# Altium footprint library Package_DIP.PcbLib: 236 footprints (part 10 of 15)
Each footprint in its own frame and in the unit in brackets; x right, y up, seen from the top. Pads: shape width x height; smd on the part's side, far side on the other; paste and mask are expansions set on the pad; w line width, h text height; cw(c..) or ccw(c..) is an arc to the next point about the centre after c.
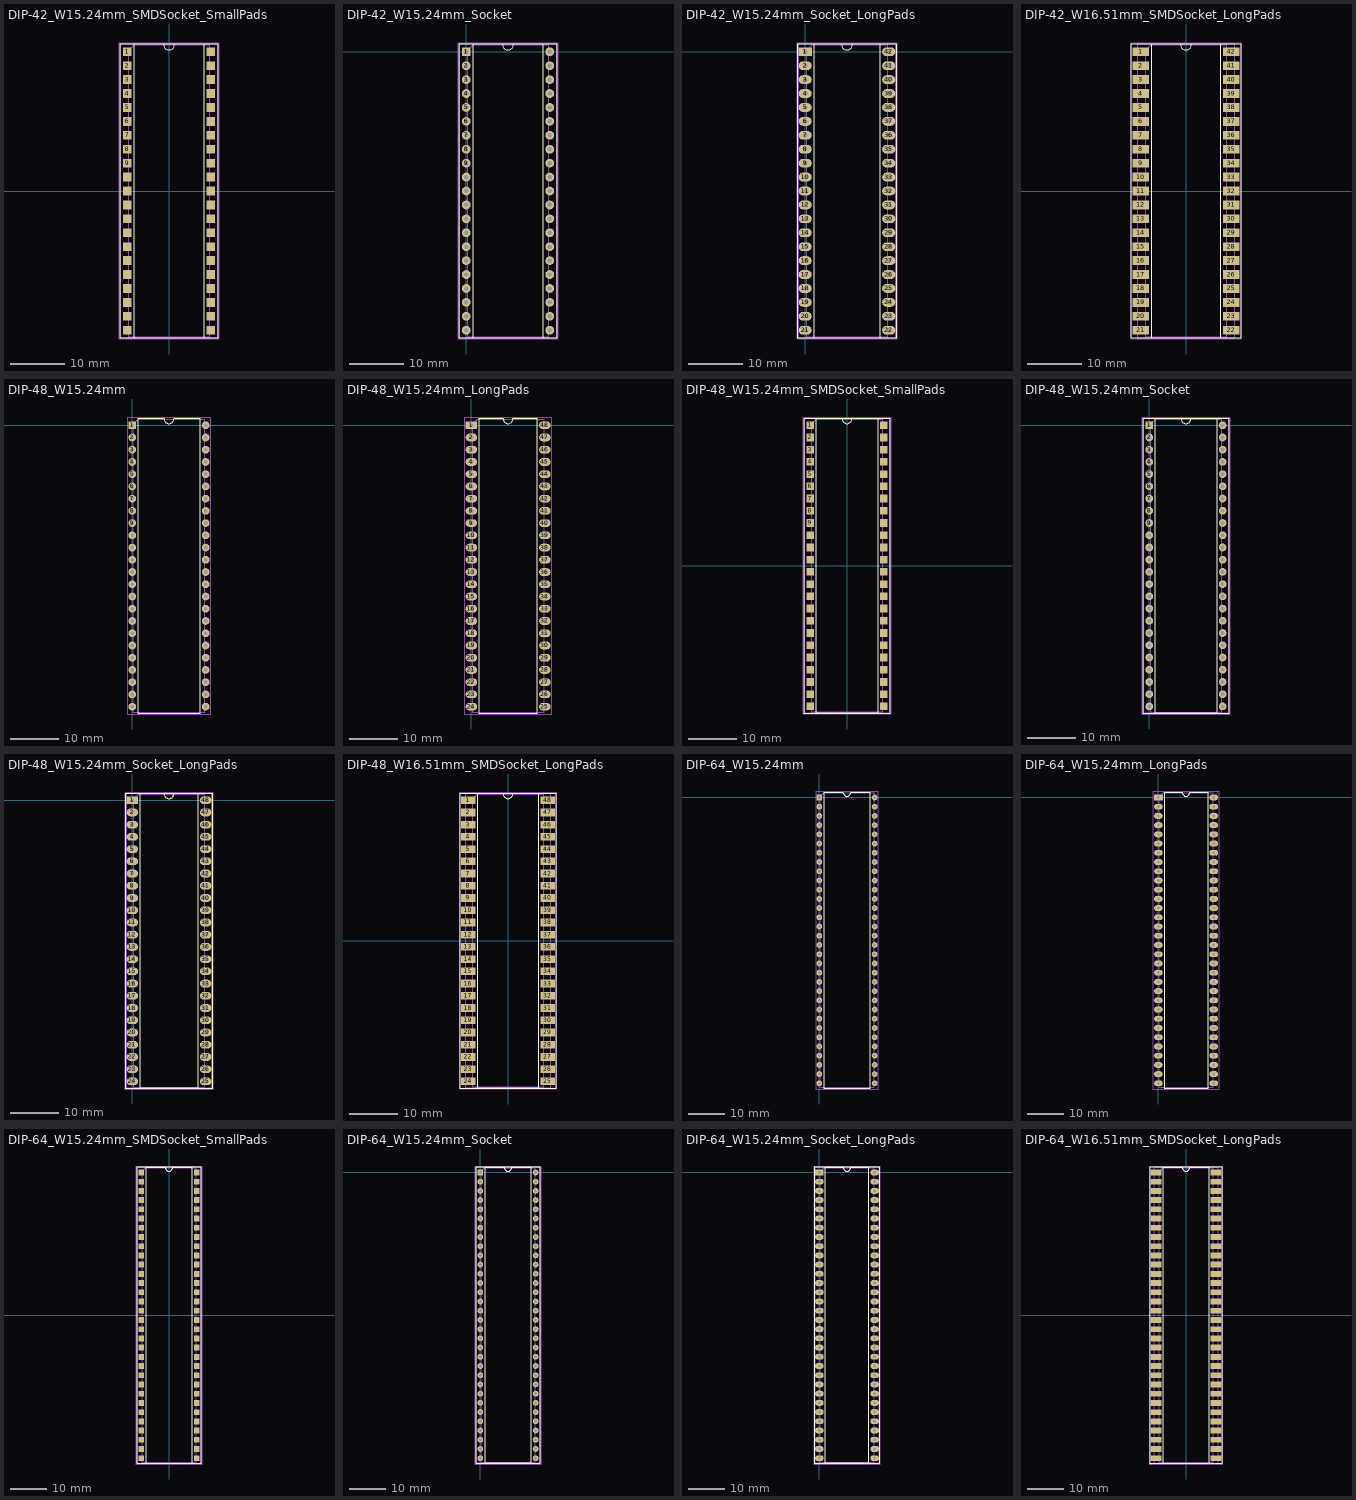
[diagram p9: the footprints below, top view; thin cyan lines are the x and y axes]

## DIP-42_W15.24mm_SMDSocket_SmallPads [mm]
pads (42):
  rect 1.6x1.6 smd: 1(-7.62,25.4) 2(-7.62,22.86) 3(-7.62,20.32) 4(-7.62,17.78) 5(-7.62,15.24) 6(-7.62,12.7) 7(-7.62,10.16) 8(-7.62,7.62) 9(-7.62,5.08) 10(-7.62,2.54) 11(-7.62,0) 12(-7.62,-2.54) 13(-7.62,-5.08) 14(-7.62,-7.62) 15(-7.62,-10.16) 16(-7.62,-12.7) 17(-7.62,-15.24) 18(-7.62,-17.78) 19(-7.62,-20.32) 20(-7.62,-22.86) 21(-7.62,-25.4) 22(7.62,-25.4) 23(7.62,-22.86) 24(7.62,-20.32) 25(7.62,-17.78) 26(7.62,-15.24) 27(7.62,-12.7) 28(7.62,-10.16) 29(7.62,-7.62) 30(7.62,-5.08) 31(7.62,-2.54) 32(7.62,0) 33(7.62,2.54) 34(7.62,5.08) 35(7.62,7.62) 36(7.62,10.16) 37(7.62,12.7) 38(7.62,15.24) 39(7.62,17.78) 40(7.62,20.32) 41(7.62,22.86) 42(7.62,25.4)
F.SilkS:
  lines w0.12: -8.95,-26.79 -8.95,26.79 8.95,26.79 8.95,-26.79 -8.95,-26.79 ; -6.46,-26.73 -6.46,26.73 -1,26.73 ccw(c0,26.73) 1,26.73 6.46,26.73 6.46,-26.73 -6.46,-26.73
F.CrtYd:
  lines w0.05: -9.15,-27 9.15,-27 9.15,27 -9.15,27 -9.15,-27
F.Fab:
  lines w0.1: -8.89,-26.73 -8.89,26.73 8.89,26.73 8.89,-26.73 -8.89,-26.73 ; -7.365,-26.67 -7.365,25.67 -6.365,26.67 7.365,26.67 7.365,-26.67 -7.365,-26.67
  text "'.Designator'" at -4.047,-0.84 h1

## DIP-42_W15.24mm_Socket [mm]
pads (42):
  rect 1.6x1.6 hole 0.8: 1(0,0)
  rrect100% 1.6x1.6 hole 0.8: 2(0,-2.54) 3(0,-5.08) 4(0,-7.62) 5(0,-10.16) 6(0,-12.7) 7(0,-15.24) 8(0,-17.78) 9(0,-20.32) 10(0,-22.86) 11(0,-25.4) 12(0,-27.94) 13(0,-30.48) 14(0,-33.02) 15(0,-35.56) 16(0,-38.1) 17(0,-40.64) 18(0,-43.18) 19(0,-45.72) 20(0,-48.26) 21(0,-50.8) 22(15.24,-50.8) 23(15.24,-48.26) 24(15.24,-45.72) 25(15.24,-43.18) 26(15.24,-40.64) 27(15.24,-38.1) 28(15.24,-35.56) 29(15.24,-33.02) 30(15.24,-30.48) 31(15.24,-27.94) 32(15.24,-25.4) 33(15.24,-22.86) 34(15.24,-20.32) 35(15.24,-17.78) 36(15.24,-15.24) 37(15.24,-12.7) 38(15.24,-10.16) 39(15.24,-7.62) 40(15.24,-5.08) 41(15.24,-2.54) 42(15.24,0)
F.SilkS:
  lines w0.12: -1.33,-52.19 16.57,-52.19 16.57,1.39 -1.33,1.39 -1.33,-52.19 ; 1.16,-52.13 1.16,1.33 6.62,1.33 ccw(c7.62,1.33) 8.62,1.33 14.08,1.33 14.08,-52.13 1.16,-52.13
F.CrtYd:
  lines w0.05: -1.55,-52.4 16.8,-52.4 16.8,1.6 -1.55,1.6 -1.55,-52.4
F.Fab:
  lines w0.1: -1.27,-52.13 -1.27,1.33 16.51,1.33 16.51,-52.13 -1.27,-52.13 ; 0.255,-52.07 14.985,-52.07 14.985,1.27 1.255,1.27 0.255,0.27 0.255,-52.07
  text "'.Designator'" at 3.573,-26.24 h1

## DIP-42_W15.24mm_Socket_LongPads [mm]
pads (42):
  rect 2.4x1.6 hole 0.8: 1(0,0)
  rrect100% 2.4x1.6 hole 0.8: 2(0,-2.54) 3(0,-5.08) 4(0,-7.62) 5(0,-10.16) 6(0,-12.7) 7(0,-15.24) 8(0,-17.78) 9(0,-20.32) 10(0,-22.86) 11(0,-25.4) 12(0,-27.94) 13(0,-30.48) 14(0,-33.02) 15(0,-35.56) 16(0,-38.1) 17(0,-40.64) 18(0,-43.18) 19(0,-45.72) 20(0,-48.26) 21(0,-50.8) 22(15.24,-50.8) 23(15.24,-48.26) 24(15.24,-45.72) 25(15.24,-43.18) 26(15.24,-40.64) 27(15.24,-38.1) 28(15.24,-35.56) 29(15.24,-33.02) 30(15.24,-30.48) 31(15.24,-27.94) 32(15.24,-25.4) 33(15.24,-22.86) 34(15.24,-20.32) 35(15.24,-17.78) 36(15.24,-15.24) 37(15.24,-12.7) 38(15.24,-10.16) 39(15.24,-7.62) 40(15.24,-5.08) 41(15.24,-2.54) 42(15.24,0)
F.SilkS:
  lines w0.12: -1.44,-52.19 16.68,-52.19 16.68,1.39 -1.44,1.39 -1.44,-52.19 ; 1.56,-52.13 13.68,-52.13 13.68,1.33 8.62,1.33 cw(c7.62,1.33) 6.62,1.33 1.56,1.33 1.56,-52.13
F.CrtYd:
  lines w0.05: -1.55,-52.4 -1.55,1.6 16.8,1.6 16.8,-52.4 -1.55,-52.4
F.Fab:
  lines w0.1: -1.27,-52.13 -1.27,1.33 16.51,1.33 16.51,-52.13 -1.27,-52.13 ; 0.255,-52.07 14.985,-52.07 14.985,1.27 1.255,1.27 0.255,0.27 0.255,-52.07
  text "'.Designator'" at 3.573,-26.24 h1

## DIP-42_W16.51mm_SMDSocket_LongPads [mm]
pads (42):
  rect 3.1x1.6 smd: 1(-8.255,25.4) 2(-8.255,22.86) 3(-8.255,20.32) 4(-8.255,17.78) 5(-8.255,15.24) 6(-8.255,12.7) 7(-8.255,10.16) 8(-8.255,7.62) 9(-8.255,5.08) 10(-8.255,2.54) 11(-8.255,0) 12(-8.255,-2.54) 13(-8.255,-5.08) 14(-8.255,-7.62) 15(-8.255,-10.16) 16(-8.255,-12.7) 17(-8.255,-15.24) 18(-8.255,-17.78) 19(-8.255,-20.32) 20(-8.255,-22.86) 21(-8.255,-25.4) 22(8.255,-25.4) 23(8.255,-22.86) 24(8.255,-20.32) 25(8.255,-17.78) 26(8.255,-15.24) 27(8.255,-12.7) 28(8.255,-10.16) 29(8.255,-7.62) 30(8.255,-5.08) 31(8.255,-2.54) 32(8.255,0) 33(8.255,2.54) 34(8.255,5.08) 35(8.255,7.62) 36(8.255,10.16) 37(8.255,12.7) 38(8.255,15.24) 39(8.255,17.78) 40(8.255,20.32) 41(8.255,22.86) 42(8.255,25.4)
F.SilkS:
  lines w0.12: -10.045,-26.79 10.045,-26.79 10.045,26.79 -10.045,26.79 -10.045,-26.79 ; -6.345,-26.73 6.345,-26.73 6.345,26.73 1,26.73 cw(c0,26.73) -1,26.73 -6.345,26.73 -6.345,-26.73
F.CrtYd:
  lines w0.05: -10.1,-27 -10.1,27 10.1,27 10.1,-27 -10.1,-27
F.Fab:
  lines w0.1: -8.89,-26.73 -8.89,26.73 8.89,26.73 8.89,-26.73 -8.89,-26.73 ; -7.365,-26.67 -7.365,25.67 -6.365,26.67 7.365,26.67 7.365,-26.67 -7.365,-26.67
  text "'.Designator'" at -4.047,-0.84 h1

## DIP-48_W15.24mm [mm]
pads (48):
  rect 1.6x1.6 hole 0.8: 1(0,0)
  rrect100% 1.6x1.6 hole 0.8: 2(0,-2.54) 3(0,-5.08) 4(0,-7.62) 5(0,-10.16) 6(0,-12.7) 7(0,-15.24) 8(0,-17.78) 9(0,-20.32) 10(0,-22.86) 11(0,-25.4) 12(0,-27.94) 13(0,-30.48) 14(0,-33.02) 15(0,-35.56) 16(0,-38.1) 17(0,-40.64) 18(0,-43.18) 19(0,-45.72) 20(0,-48.26) 21(0,-50.8) 22(0,-53.34) 23(0,-55.88) 24(0,-58.42) 25(15.24,-58.42) 26(15.24,-55.88) 27(15.24,-53.34) 28(15.24,-50.8) 29(15.24,-48.26) 30(15.24,-45.72) 31(15.24,-43.18) 32(15.24,-40.64) 33(15.24,-38.1) 34(15.24,-35.56) 35(15.24,-33.02) 36(15.24,-30.48) 37(15.24,-27.94) 38(15.24,-25.4) 39(15.24,-22.86) 40(15.24,-20.32) 41(15.24,-17.78) 42(15.24,-15.24) 43(15.24,-12.7) 44(15.24,-10.16) 45(15.24,-7.62) 46(15.24,-5.08) 47(15.24,-2.54) 48(15.24,0)
F.SilkS:
  lines w0.12: 1.16,-59.75 14.08,-59.75 14.08,1.33 8.62,1.33 cw(c7.62,1.33) 6.62,1.33 1.16,1.33 1.16,-59.75
F.CrtYd:
  lines w0.05: -1.05,-59.95 16.3,-59.95 16.3,1.55 -1.05,1.55 -1.05,-59.95
F.Fab:
  lines w0.1: 0.255,-59.69 0.255,0.27 1.255,1.27 14.985,1.27 14.985,-59.69 0.255,-59.69
  text "'.Designator'" at 3.573,-30.05 h1

## DIP-48_W15.24mm_LongPads [mm]
pads (48):
  rect 2.4x1.6 hole 0.8: 1(0,0)
  rrect100% 2.4x1.6 hole 0.8: 2(0,-2.54) 3(0,-5.08) 4(0,-7.62) 5(0,-10.16) 6(0,-12.7) 7(0,-15.24) 8(0,-17.78) 9(0,-20.32) 10(0,-22.86) 11(0,-25.4) 12(0,-27.94) 13(0,-30.48) 14(0,-33.02) 15(0,-35.56) 16(0,-38.1) 17(0,-40.64) 18(0,-43.18) 19(0,-45.72) 20(0,-48.26) 21(0,-50.8) 22(0,-53.34) 23(0,-55.88) 24(0,-58.42) 25(15.24,-58.42) 26(15.24,-55.88) 27(15.24,-53.34) 28(15.24,-50.8) 29(15.24,-48.26) 30(15.24,-45.72) 31(15.24,-43.18) 32(15.24,-40.64) 33(15.24,-38.1) 34(15.24,-35.56) 35(15.24,-33.02) 36(15.24,-30.48) 37(15.24,-27.94) 38(15.24,-25.4) 39(15.24,-22.86) 40(15.24,-20.32) 41(15.24,-17.78) 42(15.24,-15.24) 43(15.24,-12.7) 44(15.24,-10.16) 45(15.24,-7.62) 46(15.24,-5.08) 47(15.24,-2.54) 48(15.24,0)
F.SilkS:
  lines w0.12: 1.56,-59.75 1.56,1.33 6.62,1.33 ccw(c7.62,1.33) 8.62,1.33 13.68,1.33 13.68,-59.75 1.56,-59.75
F.CrtYd:
  lines w0.05: -1.5,-59.95 16.7,-59.95 16.7,1.55 -1.5,1.55 -1.5,-59.95
F.Fab:
  lines w0.1: 0.255,-59.69 14.985,-59.69 14.985,1.27 1.255,1.27 0.255,0.27 0.255,-59.69
  text "'.Designator'" at 3.573,-30.05 h1

## DIP-48_W15.24mm_SMDSocket_SmallPads [mm]
pads (48):
  rect 1.6x1.6 smd: 1(-7.62,29.21) 2(-7.62,26.67) 3(-7.62,24.13) 4(-7.62,21.59) 5(-7.62,19.05) 6(-7.62,16.51) 7(-7.62,13.97) 8(-7.62,11.43) 9(-7.62,8.89) 10(-7.62,6.35) 11(-7.62,3.81) 12(-7.62,1.27) 13(-7.62,-1.27) 14(-7.62,-3.81) 15(-7.62,-6.35) 16(-7.62,-8.89) 17(-7.62,-11.43) 18(-7.62,-13.97) 19(-7.62,-16.51) 20(-7.62,-19.05) 21(-7.62,-21.59) 22(-7.62,-24.13) 23(-7.62,-26.67) 24(-7.62,-29.21) 25(7.62,-29.21) 26(7.62,-26.67) 27(7.62,-24.13) 28(7.62,-21.59) 29(7.62,-19.05) 30(7.62,-16.51) 31(7.62,-13.97) 32(7.62,-11.43) 33(7.62,-8.89) 34(7.62,-6.35) 35(7.62,-3.81) 36(7.62,-1.27) 37(7.62,1.27) 38(7.62,3.81) 39(7.62,6.35) 40(7.62,8.89) 41(7.62,11.43) 42(7.62,13.97) 43(7.62,16.51) 44(7.62,19.05) 45(7.62,21.59) 46(7.62,24.13) 47(7.62,26.67) 48(7.62,29.21)
F.SilkS:
  lines w0.12: -8.95,-30.6 -8.95,30.6 8.95,30.6 8.95,-30.6 -8.95,-30.6 ; -6.46,-30.54 -6.46,30.54 -1,30.54 ccw(c0,30.54) 1,30.54 6.46,30.54 6.46,-30.54 -6.46,-30.54
F.CrtYd:
  lines w0.05: -9.15,-30.8 9.15,-30.8 9.15,30.8 -9.15,30.8 -9.15,-30.8
F.Fab:
  lines w0.1: -8.89,-30.54 8.89,-30.54 8.89,30.54 -8.89,30.54 -8.89,-30.54 ; -7.365,-30.48 7.365,-30.48 7.365,30.48 -6.365,30.48 -7.365,29.48 -7.365,-30.48
  text "'.Designator'" at -4.047,-0.84 h1

## DIP-48_W15.24mm_Socket [mm]
pads (48):
  rect 1.6x1.6 hole 0.8: 1(0,0)
  rrect100% 1.6x1.6 hole 0.8: 2(0,-2.54) 3(0,-5.08) 4(0,-7.62) 5(0,-10.16) 6(0,-12.7) 7(0,-15.24) 8(0,-17.78) 9(0,-20.32) 10(0,-22.86) 11(0,-25.4) 12(0,-27.94) 13(0,-30.48) 14(0,-33.02) 15(0,-35.56) 16(0,-38.1) 17(0,-40.64) 18(0,-43.18) 19(0,-45.72) 20(0,-48.26) 21(0,-50.8) 22(0,-53.34) 23(0,-55.88) 24(0,-58.42) 25(15.24,-58.42) 26(15.24,-55.88) 27(15.24,-53.34) 28(15.24,-50.8) 29(15.24,-48.26) 30(15.24,-45.72) 31(15.24,-43.18) 32(15.24,-40.64) 33(15.24,-38.1) 34(15.24,-35.56) 35(15.24,-33.02) 36(15.24,-30.48) 37(15.24,-27.94) 38(15.24,-25.4) 39(15.24,-22.86) 40(15.24,-20.32) 41(15.24,-17.78) 42(15.24,-15.24) 43(15.24,-12.7) 44(15.24,-10.16) 45(15.24,-7.62) 46(15.24,-5.08) 47(15.24,-2.54) 48(15.24,0)
F.SilkS:
  lines w0.12: -1.33,-59.81 16.57,-59.81 16.57,1.39 -1.33,1.39 -1.33,-59.81 ; 1.16,-59.75 1.16,1.33 6.62,1.33 ccw(c7.62,1.33) 8.62,1.33 14.08,1.33 14.08,-59.75 1.16,-59.75
F.CrtYd:
  lines w0.05: -1.55,-60 -1.55,1.6 16.8,1.6 16.8,-60 -1.55,-60
F.Fab:
  lines w0.1: -1.27,-59.75 16.51,-59.75 16.51,1.33 -1.27,1.33 -1.27,-59.75 ; 0.255,-59.69 0.255,0.27 1.255,1.27 14.985,1.27 14.985,-59.69 0.255,-59.69
  text "'.Designator'" at 3.573,-30.05 h1

## DIP-48_W15.24mm_Socket_LongPads [mm]
pads (48):
  rect 2.4x1.6 hole 0.8: 1(0,0)
  rrect100% 2.4x1.6 hole 0.8: 2(0,-2.54) 3(0,-5.08) 4(0,-7.62) 5(0,-10.16) 6(0,-12.7) 7(0,-15.24) 8(0,-17.78) 9(0,-20.32) 10(0,-22.86) 11(0,-25.4) 12(0,-27.94) 13(0,-30.48) 14(0,-33.02) 15(0,-35.56) 16(0,-38.1) 17(0,-40.64) 18(0,-43.18) 19(0,-45.72) 20(0,-48.26) 21(0,-50.8) 22(0,-53.34) 23(0,-55.88) 24(0,-58.42) 25(15.24,-58.42) 26(15.24,-55.88) 27(15.24,-53.34) 28(15.24,-50.8) 29(15.24,-48.26) 30(15.24,-45.72) 31(15.24,-43.18) 32(15.24,-40.64) 33(15.24,-38.1) 34(15.24,-35.56) 35(15.24,-33.02) 36(15.24,-30.48) 37(15.24,-27.94) 38(15.24,-25.4) 39(15.24,-22.86) 40(15.24,-20.32) 41(15.24,-17.78) 42(15.24,-15.24) 43(15.24,-12.7) 44(15.24,-10.16) 45(15.24,-7.62) 46(15.24,-5.08) 47(15.24,-2.54) 48(15.24,0)
F.SilkS:
  lines w0.12: -1.44,-59.81 16.68,-59.81 16.68,1.39 -1.44,1.39 -1.44,-59.81 ; 1.56,-59.75 1.56,1.33 6.62,1.33 ccw(c7.62,1.33) 8.62,1.33 13.68,1.33 13.68,-59.75 1.56,-59.75
F.CrtYd:
  lines w0.05: -1.55,-60 16.8,-60 16.8,1.6 -1.55,1.6 -1.55,-60
F.Fab:
  lines w0.1: -1.27,-59.75 -1.27,1.33 16.51,1.33 16.51,-59.75 -1.27,-59.75 ; 0.255,-59.69 0.255,0.27 1.255,1.27 14.985,1.27 14.985,-59.69 0.255,-59.69
  text "'.Designator'" at 3.573,-30.05 h1

## DIP-48_W16.51mm_SMDSocket_LongPads [mm]
pads (48):
  rect 3.1x1.6 smd: 1(-8.255,29.21) 2(-8.255,26.67) 3(-8.255,24.13) 4(-8.255,21.59) 5(-8.255,19.05) 6(-8.255,16.51) 7(-8.255,13.97) 8(-8.255,11.43) 9(-8.255,8.89) 10(-8.255,6.35) 11(-8.255,3.81) 12(-8.255,1.27) 13(-8.255,-1.27) 14(-8.255,-3.81) 15(-8.255,-6.35) 16(-8.255,-8.89) 17(-8.255,-11.43) 18(-8.255,-13.97) 19(-8.255,-16.51) 20(-8.255,-19.05) 21(-8.255,-21.59) 22(-8.255,-24.13) 23(-8.255,-26.67) 24(-8.255,-29.21) 25(8.255,-29.21) 26(8.255,-26.67) 27(8.255,-24.13) 28(8.255,-21.59) 29(8.255,-19.05) 30(8.255,-16.51) 31(8.255,-13.97) 32(8.255,-11.43) 33(8.255,-8.89) 34(8.255,-6.35) 35(8.255,-3.81) 36(8.255,-1.27) 37(8.255,1.27) 38(8.255,3.81) 39(8.255,6.35) 40(8.255,8.89) 41(8.255,11.43) 42(8.255,13.97) 43(8.255,16.51) 44(8.255,19.05) 45(8.255,21.59) 46(8.255,24.13) 47(8.255,26.67) 48(8.255,29.21)
F.SilkS:
  lines w0.12: -10.045,-30.6 -10.045,30.6 10.045,30.6 10.045,-30.6 -10.045,-30.6 ; -6.345,-30.54 6.345,-30.54 6.345,30.54 1,30.54 cw(c0,30.54) -1,30.54 -6.345,30.54 -6.345,-30.54
F.CrtYd:
  lines w0.05: -10.1,-30.8 -10.1,30.8 10.1,30.8 10.1,-30.8 -10.1,-30.8
F.Fab:
  lines w0.1: -8.89,-30.54 8.89,-30.54 8.89,30.54 -8.89,30.54 -8.89,-30.54 ; -7.365,-30.48 -7.365,29.48 -6.365,30.48 7.365,30.48 7.365,-30.48 -7.365,-30.48
  text "'.Designator'" at -4.047,-0.84 h1

## DIP-64_W15.24mm [mm]
pads (64):
  rect 1.6x1.6 hole 0.8: 1(0,0)
  rrect100% 1.6x1.6 hole 0.8: 2(0,-2.54) 3(0,-5.08) 4(0,-7.62) 5(0,-10.16) 6(0,-12.7) 7(0,-15.24) 8(0,-17.78) 9(0,-20.32) 10(0,-22.86) 11(0,-25.4) 12(0,-27.94) 13(0,-30.48) 14(0,-33.02) 15(0,-35.56) 16(0,-38.1) 17(0,-40.64) 18(0,-43.18) 19(0,-45.72) 20(0,-48.26) 21(0,-50.8) 22(0,-53.34) 23(0,-55.88) 24(0,-58.42) 25(0,-60.96) 26(0,-63.5) 27(0,-66.04) 28(0,-68.58) 29(0,-71.12) 30(0,-73.66) 31(0,-76.2) 32(0,-78.74) 33(15.24,-78.74) 34(15.24,-76.2) 35(15.24,-73.66) 36(15.24,-71.12) 37(15.24,-68.58) 38(15.24,-66.04) 39(15.24,-63.5) 40(15.24,-60.96) 41(15.24,-58.42) 42(15.24,-55.88) 43(15.24,-53.34) 44(15.24,-50.8) 45(15.24,-48.26) 46(15.24,-45.72) 47(15.24,-43.18) 48(15.24,-40.64) 49(15.24,-38.1) 50(15.24,-35.56) 51(15.24,-33.02) 52(15.24,-30.48) 53(15.24,-27.94) 54(15.24,-25.4) 55(15.24,-22.86) 56(15.24,-20.32) 57(15.24,-17.78) 58(15.24,-15.24) 59(15.24,-12.7) 60(15.24,-10.16) 61(15.24,-7.62) 62(15.24,-5.08) 63(15.24,-2.54) 64(15.24,0)
F.SilkS:
  lines w0.12: 1.16,-80.07 1.16,1.33 6.62,1.33 ccw(c7.62,1.33) 8.62,1.33 14.08,1.33 14.08,-80.07 1.16,-80.07
F.CrtYd:
  lines w0.05: -1.05,-80.3 -1.05,1.55 16.3,1.55 16.3,-80.3 -1.05,-80.3
F.Fab:
  lines w0.1: 0.255,-80.01 0.255,0.27 1.255,1.27 14.985,1.27 14.985,-80.01 0.255,-80.01
  text "'.Designator'" at 3.573,-40.21 h1

## DIP-64_W15.24mm_LongPads [mm]
pads (64):
  rect 2.4x1.6 hole 0.8: 1(0,0)
  rrect100% 2.4x1.6 hole 0.8: 2(0,-2.54) 3(0,-5.08) 4(0,-7.62) 5(0,-10.16) 6(0,-12.7) 7(0,-15.24) 8(0,-17.78) 9(0,-20.32) 10(0,-22.86) 11(0,-25.4) 12(0,-27.94) 13(0,-30.48) 14(0,-33.02) 15(0,-35.56) 16(0,-38.1) 17(0,-40.64) 18(0,-43.18) 19(0,-45.72) 20(0,-48.26) 21(0,-50.8) 22(0,-53.34) 23(0,-55.88) 24(0,-58.42) 25(0,-60.96) 26(0,-63.5) 27(0,-66.04) 28(0,-68.58) 29(0,-71.12) 30(0,-73.66) 31(0,-76.2) 32(0,-78.74) 33(15.24,-78.74) 34(15.24,-76.2) 35(15.24,-73.66) 36(15.24,-71.12) 37(15.24,-68.58) 38(15.24,-66.04) 39(15.24,-63.5) 40(15.24,-60.96) 41(15.24,-58.42) 42(15.24,-55.88) 43(15.24,-53.34) 44(15.24,-50.8) 45(15.24,-48.26) 46(15.24,-45.72) 47(15.24,-43.18) 48(15.24,-40.64) 49(15.24,-38.1) 50(15.24,-35.56) 51(15.24,-33.02) 52(15.24,-30.48) 53(15.24,-27.94) 54(15.24,-25.4) 55(15.24,-22.86) 56(15.24,-20.32) 57(15.24,-17.78) 58(15.24,-15.24) 59(15.24,-12.7) 60(15.24,-10.16) 61(15.24,-7.62) 62(15.24,-5.08) 63(15.24,-2.54) 64(15.24,0)
F.SilkS:
  lines w0.12: 1.56,-80.07 13.68,-80.07 13.68,1.33 8.62,1.33 cw(c7.62,1.33) 6.62,1.33 1.56,1.33 1.56,-80.07
F.CrtYd:
  lines w0.05: -1.5,-80.3 -1.5,1.55 16.7,1.55 16.7,-80.3 -1.5,-80.3
F.Fab:
  lines w0.1: 0.255,-80.01 14.985,-80.01 14.985,1.27 1.255,1.27 0.255,0.27 0.255,-80.01
  text "'.Designator'" at 3.573,-40.21 h1

## DIP-64_W15.24mm_SMDSocket_SmallPads [mm]
pads (64):
  rect 1.6x1.6 smd: 1(-7.62,39.37) 2(-7.62,36.83) 3(-7.62,34.29) 4(-7.62,31.75) 5(-7.62,29.21) 6(-7.62,26.67) 7(-7.62,24.13) 8(-7.62,21.59) 9(-7.62,19.05) 10(-7.62,16.51) 11(-7.62,13.97) 12(-7.62,11.43) 13(-7.62,8.89) 14(-7.62,6.35) 15(-7.62,3.81) 16(-7.62,1.27) 17(-7.62,-1.27) 18(-7.62,-3.81) 19(-7.62,-6.35) 20(-7.62,-8.89) 21(-7.62,-11.43) 22(-7.62,-13.97) 23(-7.62,-16.51) 24(-7.62,-19.05) 25(-7.62,-21.59) 26(-7.62,-24.13) 27(-7.62,-26.67) 28(-7.62,-29.21) 29(-7.62,-31.75) 30(-7.62,-34.29) 31(-7.62,-36.83) 32(-7.62,-39.37) 33(7.62,-39.37) 34(7.62,-36.83) 35(7.62,-34.29) 36(7.62,-31.75) 37(7.62,-29.21) 38(7.62,-26.67) 39(7.62,-24.13) 40(7.62,-21.59) 41(7.62,-19.05) 42(7.62,-16.51) 43(7.62,-13.97) 44(7.62,-11.43) 45(7.62,-8.89) 46(7.62,-6.35) 47(7.62,-3.81) 48(7.62,-1.27) 49(7.62,1.27) 50(7.62,3.81) 51(7.62,6.35) 52(7.62,8.89) 53(7.62,11.43) 54(7.62,13.97) 55(7.62,16.51) 56(7.62,19.05) 57(7.62,21.59) 58(7.62,24.13) 59(7.62,26.67) 60(7.62,29.21) 61(7.62,31.75) 62(7.62,34.29) 63(7.62,36.83) 64(7.62,39.37)
F.SilkS:
  lines w0.12: -8.95,-40.76 8.95,-40.76 8.95,40.76 -8.95,40.76 -8.95,-40.76 ; -6.46,-40.7 6.46,-40.7 6.46,40.7 1,40.7 cw(c0,40.7) -1,40.7 -6.46,40.7 -6.46,-40.7
F.CrtYd:
  lines w0.05: -9.15,-40.95 9.15,-40.95 9.15,40.95 -9.15,40.95 -9.15,-40.95
F.Fab:
  lines w0.1: -8.89,-40.7 -8.89,40.7 8.89,40.7 8.89,-40.7 -8.89,-40.7 ; -7.365,-40.64 7.365,-40.64 7.365,40.64 -6.365,40.64 -7.365,39.64 -7.365,-40.64
  text "'.Designator'" at -4.047,-0.84 h1

## DIP-64_W15.24mm_Socket [mm]
pads (64):
  rect 1.6x1.6 hole 0.8: 1(0,0)
  rrect100% 1.6x1.6 hole 0.8: 2(0,-2.54) 3(0,-5.08) 4(0,-7.62) 5(0,-10.16) 6(0,-12.7) 7(0,-15.24) 8(0,-17.78) 9(0,-20.32) 10(0,-22.86) 11(0,-25.4) 12(0,-27.94) 13(0,-30.48) 14(0,-33.02) 15(0,-35.56) 16(0,-38.1) 17(0,-40.64) 18(0,-43.18) 19(0,-45.72) 20(0,-48.26) 21(0,-50.8) 22(0,-53.34) 23(0,-55.88) 24(0,-58.42) 25(0,-60.96) 26(0,-63.5) 27(0,-66.04) 28(0,-68.58) 29(0,-71.12) 30(0,-73.66) 31(0,-76.2) 32(0,-78.74) 33(15.24,-78.74) 34(15.24,-76.2) 35(15.24,-73.66) 36(15.24,-71.12) 37(15.24,-68.58) 38(15.24,-66.04) 39(15.24,-63.5) 40(15.24,-60.96) 41(15.24,-58.42) 42(15.24,-55.88) 43(15.24,-53.34) 44(15.24,-50.8) 45(15.24,-48.26) 46(15.24,-45.72) 47(15.24,-43.18) 48(15.24,-40.64) 49(15.24,-38.1) 50(15.24,-35.56) 51(15.24,-33.02) 52(15.24,-30.48) 53(15.24,-27.94) 54(15.24,-25.4) 55(15.24,-22.86) 56(15.24,-20.32) 57(15.24,-17.78) 58(15.24,-15.24) 59(15.24,-12.7) 60(15.24,-10.16) 61(15.24,-7.62) 62(15.24,-5.08) 63(15.24,-2.54) 64(15.24,0)
F.SilkS:
  lines w0.12: -1.33,-80.13 -1.33,1.39 16.57,1.39 16.57,-80.13 -1.33,-80.13 ; 1.16,-80.07 1.16,1.33 6.62,1.33 ccw(c7.62,1.33) 8.62,1.33 14.08,1.33 14.08,-80.07 1.16,-80.07
F.CrtYd:
  lines w0.05: -1.55,-80.35 16.8,-80.35 16.8,1.6 -1.55,1.6 -1.55,-80.35
F.Fab:
  lines w0.1: -1.27,-80.07 -1.27,1.33 16.51,1.33 16.51,-80.07 -1.27,-80.07 ; 0.255,-80.01 0.255,0.27 1.255,1.27 14.985,1.27 14.985,-80.01 0.255,-80.01
  text "'.Designator'" at 3.573,-40.21 h1

## DIP-64_W15.24mm_Socket_LongPads [mm]
pads (64):
  rect 2.4x1.6 hole 0.8: 1(0,0)
  rrect100% 2.4x1.6 hole 0.8: 2(0,-2.54) 3(0,-5.08) 4(0,-7.62) 5(0,-10.16) 6(0,-12.7) 7(0,-15.24) 8(0,-17.78) 9(0,-20.32) 10(0,-22.86) 11(0,-25.4) 12(0,-27.94) 13(0,-30.48) 14(0,-33.02) 15(0,-35.56) 16(0,-38.1) 17(0,-40.64) 18(0,-43.18) 19(0,-45.72) 20(0,-48.26) 21(0,-50.8) 22(0,-53.34) 23(0,-55.88) 24(0,-58.42) 25(0,-60.96) 26(0,-63.5) 27(0,-66.04) 28(0,-68.58) 29(0,-71.12) 30(0,-73.66) 31(0,-76.2) 32(0,-78.74) 33(15.24,-78.74) 34(15.24,-76.2) 35(15.24,-73.66) 36(15.24,-71.12) 37(15.24,-68.58) 38(15.24,-66.04) 39(15.24,-63.5) 40(15.24,-60.96) 41(15.24,-58.42) 42(15.24,-55.88) 43(15.24,-53.34) 44(15.24,-50.8) 45(15.24,-48.26) 46(15.24,-45.72) 47(15.24,-43.18) 48(15.24,-40.64) 49(15.24,-38.1) 50(15.24,-35.56) 51(15.24,-33.02) 52(15.24,-30.48) 53(15.24,-27.94) 54(15.24,-25.4) 55(15.24,-22.86) 56(15.24,-20.32) 57(15.24,-17.78) 58(15.24,-15.24) 59(15.24,-12.7) 60(15.24,-10.16) 61(15.24,-7.62) 62(15.24,-5.08) 63(15.24,-2.54) 64(15.24,0)
F.SilkS:
  lines w0.12: -1.44,-80.13 16.68,-80.13 16.68,1.39 -1.44,1.39 -1.44,-80.13 ; 1.56,-80.07 13.68,-80.07 13.68,1.33 8.62,1.33 cw(c7.62,1.33) 6.62,1.33 1.56,1.33 1.56,-80.07
F.CrtYd:
  lines w0.05: -1.55,-80.35 16.8,-80.35 16.8,1.6 -1.55,1.6 -1.55,-80.35
F.Fab:
  lines w0.1: -1.27,-80.07 16.51,-80.07 16.51,1.33 -1.27,1.33 -1.27,-80.07 ; 0.255,-80.01 14.985,-80.01 14.985,1.27 1.255,1.27 0.255,0.27 0.255,-80.01
  text "'.Designator'" at 3.573,-40.21 h1

## DIP-64_W16.51mm_SMDSocket_LongPads [mm]
pads (64):
  rect 3.1x1.6 smd: 1(-8.255,39.37) 2(-8.255,36.83) 3(-8.255,34.29) 4(-8.255,31.75) 5(-8.255,29.21) 6(-8.255,26.67) 7(-8.255,24.13) 8(-8.255,21.59) 9(-8.255,19.05) 10(-8.255,16.51) 11(-8.255,13.97) 12(-8.255,11.43) 13(-8.255,8.89) 14(-8.255,6.35) 15(-8.255,3.81) 16(-8.255,1.27) 17(-8.255,-1.27) 18(-8.255,-3.81) 19(-8.255,-6.35) 20(-8.255,-8.89) 21(-8.255,-11.43) 22(-8.255,-13.97) 23(-8.255,-16.51) 24(-8.255,-19.05) 25(-8.255,-21.59) 26(-8.255,-24.13) 27(-8.255,-26.67) 28(-8.255,-29.21) 29(-8.255,-31.75) 30(-8.255,-34.29) 31(-8.255,-36.83) 32(-8.255,-39.37) 33(8.255,-39.37) 34(8.255,-36.83) 35(8.255,-34.29) 36(8.255,-31.75) 37(8.255,-29.21) 38(8.255,-26.67) 39(8.255,-24.13) 40(8.255,-21.59) 41(8.255,-19.05) 42(8.255,-16.51) 43(8.255,-13.97) 44(8.255,-11.43) 45(8.255,-8.89) 46(8.255,-6.35) 47(8.255,-3.81) 48(8.255,-1.27) 49(8.255,1.27) 50(8.255,3.81) 51(8.255,6.35) 52(8.255,8.89) 53(8.255,11.43) 54(8.255,13.97) 55(8.255,16.51) 56(8.255,19.05) 57(8.255,21.59) 58(8.255,24.13) 59(8.255,26.67) 60(8.255,29.21) 61(8.255,31.75) 62(8.255,34.29) 63(8.255,36.83) 64(8.255,39.37)
F.SilkS:
  lines w0.12: -10.045,-40.76 -10.045,40.76 10.045,40.76 10.045,-40.76 -10.045,-40.76 ; -6.345,-40.7 6.345,-40.7 6.345,40.7 1,40.7 cw(c0,40.7) -1,40.7 -6.345,40.7 -6.345,-40.7
F.CrtYd:
  lines w0.05: -10.1,-40.95 -10.1,40.95 10.1,40.95 10.1,-40.95 -10.1,-40.95
F.Fab:
  lines w0.1: -8.89,-40.7 8.89,-40.7 8.89,40.7 -8.89,40.7 -8.89,-40.7 ; -7.365,-40.64 -7.365,39.64 -6.365,40.64 7.365,40.64 7.365,-40.64 -7.365,-40.64
  text "'.Designator'" at -4.047,-0.84 h1